# Altium footprint library AMMDK_Parts.PcbLib: 25 footprints (part 1 of 2)
Each footprint in its own frame and in the unit in brackets; x right, y up, seen from the top. Pads: shape width x height; smd on the part's side, far side on the other; paste and mask are expansions set on the pad; w line width, h text height; cw(c..) or ccw(c..) is an arc to the next point about the centre after c.
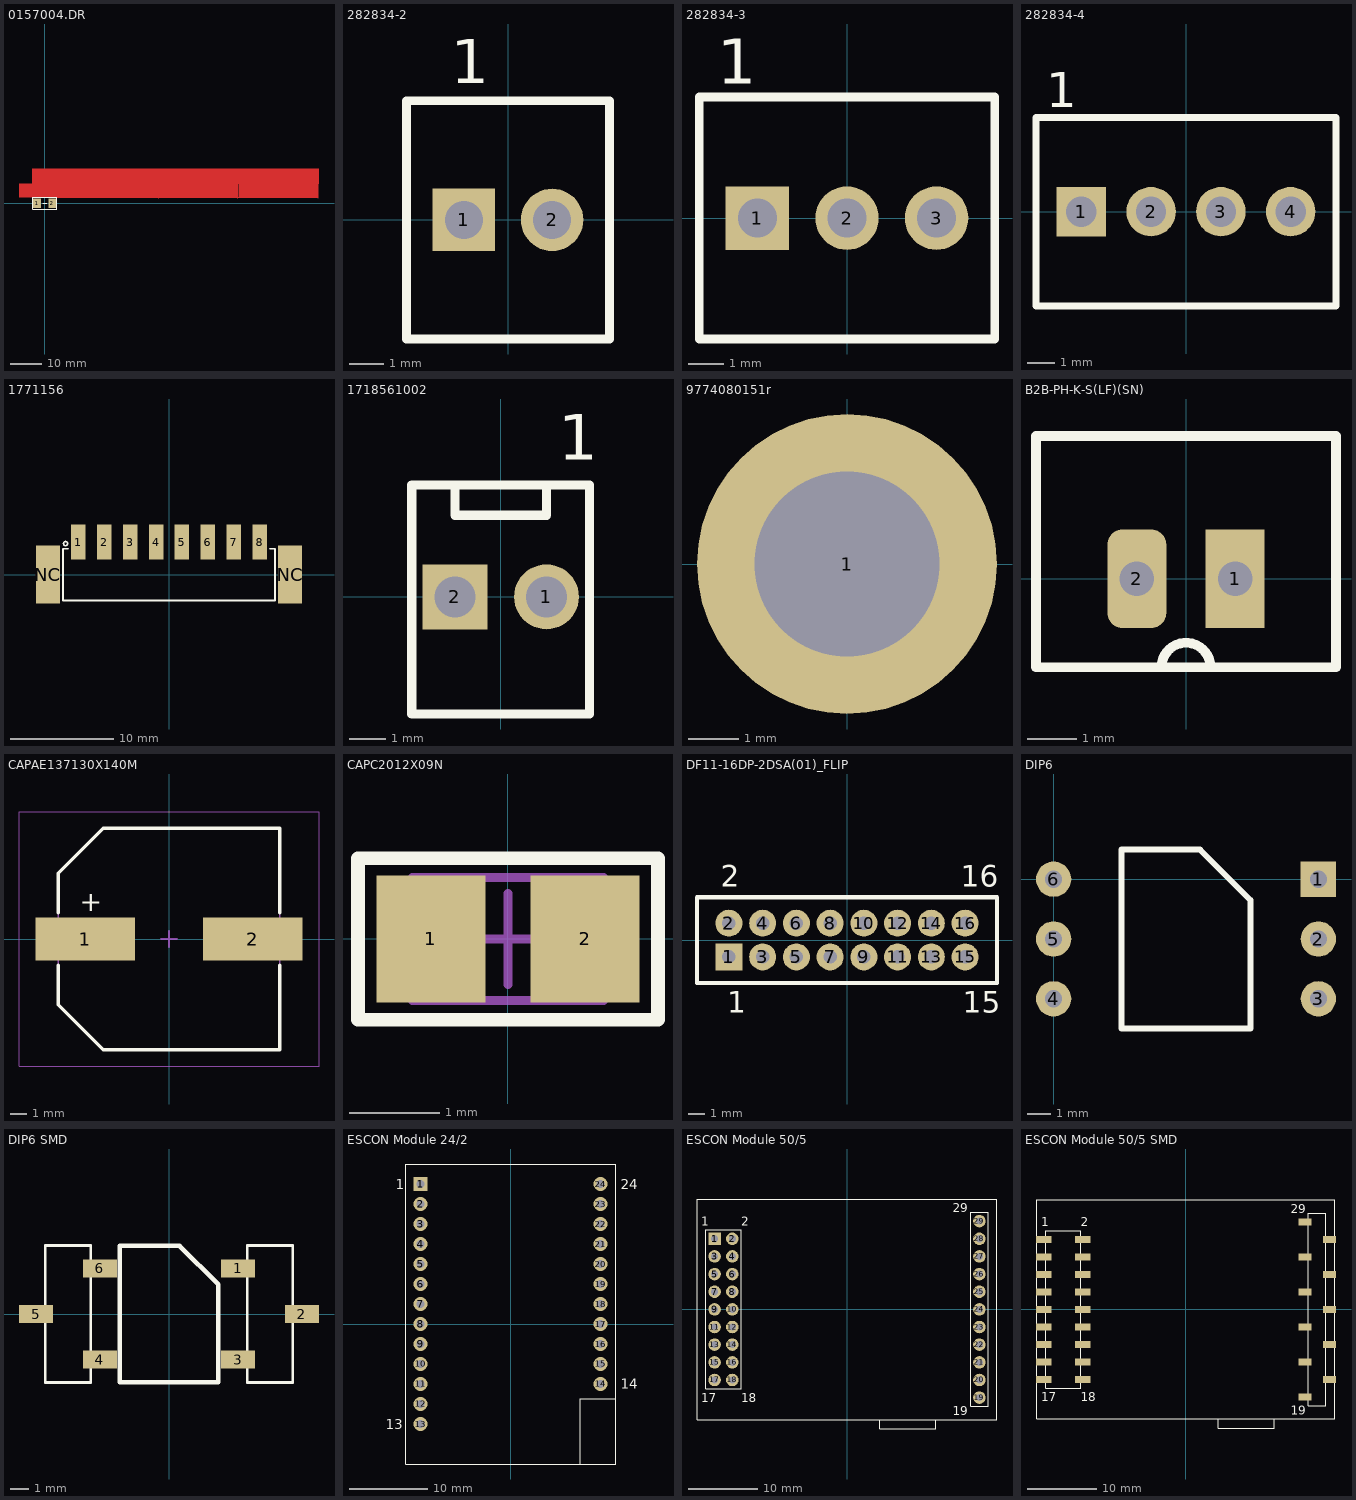
[diagram p0: the footprints below, top view; thin cyan lines are the x and y axes]

## 0157004.DR [mm]
pads (2):
  rect 2.4x3 smd: 1(-2.43,0) 2(2.43,0)
Top Layer:
  region: -3.9,10.843 36.313,10.843 36.313,6.086 -3.9,6.086
  region: -3.9,10.843 36.313,10.843 36.313,10.579 -3.9,10.579
  region: -3.9,6.351 36.313,6.351 36.313,6.086 -3.9,6.086
  region: 36.049,10.315 36.313,10.315 36.313,6.615 36.049,6.615
  region: 36.313,10.843 61.446,10.843 61.446,6.086 36.313,6.086
  region: 36.313,10.843 61.446,10.843 61.446,10.579 36.313,10.579
  region: 36.313,6.351 61.446,6.351 61.446,6.086 36.313,6.086
  region: 61.182,10.315 61.446,10.315 61.446,6.615 61.182,6.615
  region: 61.446,10.843 86.844,10.843 86.844,6.086 61.446,6.086
  region: 61.446,10.843 86.844,10.843 86.844,10.579 61.446,10.579
  region: 61.446,6.351 86.844,6.351 86.844,6.086 61.446,6.086
  region: 86.58,10.843 86.844,10.843 86.844,6.351 86.58,6.351
  region: -8.133,6.086 -4.165,6.086 -4.165,1.858 -8.133,1.858
  region: -3.9,6.086 0.333,6.086 0.333,1.858 -3.9,1.858
  region: 0.333,6.086 36.049,6.086 36.049,1.858 0.333,1.858
  region: 36.313,6.086 61.182,6.086 61.182,1.858 36.313,1.858
  region: 61.446,6.086 86.58,6.086 86.58,1.858 61.446,1.858
  lines w0.265: -3.9,1.858 86.58,1.858 86.58,6.086 86.58,1.594 ; 36.049,1.594 36.049,6.086 ; 61.182,1.594 61.182,6.086
  text "N" at -3.106,7.178 h3.33
  text "a" at -0.992,7.178 h3.33
  text "m" at 0.593,7.178 h3.33
  text "e" at 2.972,7.178 h3.33
  text "P" at 37.107,7.178 h3.33
  text "a" at 38.692,7.178 h3.33
  text "d" at 40.278,7.178 h3.33
  text "s" at 42.128,7.178 h3.33
  text "P" at 62.24,7.178 h3.33
  text "r" at 63.826,7.178 h3.33
  text "i" at 64.883,7.178 h3.33
  text "m" at 65.676,7.178 h3.33
  text "i" at 68.054,7.178 h3.33
  text "t" at 68.847,7.178 h3.33
  text "i" at 69.904,7.178 h3.33
  text "v" at 70.697,7.178 h3.33
  text "e" at 72.018,7.178 h3.33
  text "s" at 73.604,7.178 h3.33
  text "B" at 0.862,2.685 h3.33
  text "2" at 2.712,2.685 h3.33
  text "B" at 4.298,2.685 h3.33
  text "-" at 6.147,2.685 h3.33
  text "P" at 7.205,2.685 h3.33
  text "H" at 8.79,2.685 h3.33
  text "-" at 10.904,2.685 h3.33
  text "K" at 11.961,2.685 h3.33
  text "-" at 13.547,2.685 h3.33
  text "S" at 14.604,2.685 h3.33
  text "(" at 16.19,2.685 h3.33
  text "L" at 16.983,2.685 h3.33
  text "F" at 18.304,2.685 h3.33
  text ")" at 19.89,2.685 h3.33
  text "(" at 20.682,2.685 h3.33
  text "S" at 21.475,2.685 h3.33
  text "N" at 23.061,2.685 h3.33
  text ")" at 25.175,2.685 h3.33
  text "2" at 36.842,2.685 h3.33
  text "1" at 61.975,2.685 h3.33
  text "0" at 63.561,2.685 h3.33
Top Overlay:
  lines w0.254: -0.635,0 0.635,0 ; -3.81,-1.915 -3.81,1.915 3.81,1.915 3.81,-1.915 -3.81,-1.915
3D body: height 4.03, standoff 0, extent -3.81,-1.905 3.81,1.905

## 282834-2 [mm]
pads (2):
  rect 1.8x1.8 hole 1.1: 1(-1.27,0)
  round 1.8 hole 1.1: 2(1.27,0)
Top Overlay:
  lines w0.254: -2.921,-3.429 -2.921,3.429 2.921,3.429 2.921,-3.429 -2.921,-3.429
  text "1" at -1.651,3.937 h1.27
3D body "282834-2.sldprt": height 10, standoff -3.4, extent -2.77,-3.25 2.77,3.25

## 282834-3 [mm]
pads (3):
  rect 1.8x1.8 hole 1.1: 1(-2.54,0)
  round 1.8 hole 1.1: 2(0,0) 3(2.54,0)
Top Overlay:
  lines w0.254: -4.191,-3.429 4.191,-3.429 4.191,3.429 -4.191,3.429 -4.191,-3.429
  text "1" at -3.683,3.81 h1.27
3D body "c-282834-3-c-3d.stp": height 10, standoff -3.4, extent -4.04,-3.25 4.04,3.25

## 282834-4 [mm]
pads (4):
  rect 1.8x1.8 hole 1.1: 1(-3.81,0)
  round 1.8 hole 1.1: 2(-1.27,0) 3(1.27,0) 4(3.81,0)
Top Overlay:
  lines w0.254: -5.461,-3.429 -5.461,3.429 5.461,3.429 5.461,-3.429 -5.461,-3.429
  text "1" at -5.08,3.81 h1.27
3D body "282834-4.sldprt": height 10, standoff -3.4, extent -5.31,-3.25 5.31,3.25

## 1771156 [mm] "CONN TERM BLK 8POS 2.5MM SMD"
pads (10):
  rect 1.4x3.4 smd: 1(-8.75,3.15) 2(-6.25,3.15) 3(-3.75,3.15) 4(-1.25,3.15) 5(1.25,3.15) 6(3.75,3.15) 7(6.25,3.15) 8(8.75,3.15)
  rect 2.3x5.6 smd: NC(-11.7,0) NC(11.7,0)
Top Overlay:
  circle w0.152: c-10,3 r0.2
  lines w0.152: -9.75,2.5 -10.25,2.5 -10.25,-2.5 10.25,-2.5 10.25,2.5 9.75,2.5
3D body "1771156.stp": height 9, standoff 0, extent -12.55,-2.5 12.55,4.5

## 1718561002 [mm]
height 10.62
pads (2):
  round 1.8 hole 1.14: 1(1.27,0)
  rect 1.8x1.8 hole 1.14: 2(-1.27,0)
Top Overlay:
  lines w0.254: -1.27,3.1 -1.27,2.26 1.27,2.26 1.27,3.1 ; 2.465,-3.25 -2.465,-3.25 -2.465,3.1 2.465,3.1 2.465,-3.2
  text "1" at 1.6,3.8 h1.27
3D body "1718561002.sldprt": height 10.62, standoff -2.34, extent -2.464,-3.251 2.464,3.099

## 9774080151r [mm] "M2.5 Standoff"
height 8
pads (1):
  round 6 / inner round 0 / far side round 0 hole 3.7 unplated: 1(0,0)
3D body "9774080151r.sldprt": height 8, standoff -1.4, extent -2.55,-2.547 2.55,2.547

## B2B-PH-K-S(LF)(SN) [mm]
pads (2):
  rect 1.2x2 hole 0.7: 1(1,0)
  rrect50% 1.2x2 hole 0.7: 2(-1,0)
Top Overlay:
  lines w0.2: -0.5,-1.8 cw(c0,-1.8) 0.5,-1.8 ; -0.5,2.9 3.05,2.9 3.05,-1.8 -3.05,-1.8 -3.05,2.9 0.5,2.9
3D body: height 1.4, standoff -1.4, extent 0.016,0 0.016,0
3D body "B2B-PH-K-S.step": height 6, standoff -3.4, extent -2.95,-1.7 2.95,2.8

## CAPAE137130X140M [mm] "Aluminum Electrolytic Capacitor, Body 13.00x13.00x14.00mm, IPC Low Density"
height 14
pads (2):
  rect 5.95x2.55 smd: 1(-5,0) 2(5,0)
Top Overlay:
  lines w0.2: -6.6,-1.575 -6.6,-3.937 -3.938,-6.6 6.6,-6.6 6.6,-1.575 ; -6.6,1.575 -6.6,3.938 -3.938,6.6 6.6,6.6 6.6,1.575
  text "+" at -5.334,1.27 h2.03
Mechanical 13:
  lines w0.1: -6.6,-3.937 -3.938,-6.6 6.6,-6.6 6.6,6.6 -3.938,6.6 -6.6,3.938 -6.6,-3.937
Mechanical 15:
  lines w0.05: -8.95,-7.6 -8.95,7.6 8.95,7.6 8.95,-7.6 -8.95,-7.6
  lines w0.1: -0.5,0 0.5,0 ; 0,-0.5 0,0.5
3D body: height 4.67, standoff 0, extent -6.6,-6.6 6.6,6.6
3D body: height 14, standoff 0, extent -6.5,-6.5 6.5,6.5

## CAPC2012X09N [mm] "Chip Capacitor, 2-Leads, Body 2.00x1.25mm, IPC Medium Density"
height 0.95
pads (2):
  rect 1.2x1.4 smd: 1(-0.85,0) 2(0.85,0)
Top Overlay:
  lines w0.152: -1.651,-0.889 -1.651,0.889 1.651,0.889 1.651,-0.889 -1.651,-0.889
Mechanical 13:
  lines w0.1: -1.05,-0.675 -1.05,0.675 1.05,0.675 1.05,-0.675 -1.05,-0.675
Mechanical 15:
  lines w0.1: -0.5,0 0.5,0 ; 0,-0.5 0,0.5
3D body "CAPC2012X09N.step": height 0.95, standoff 0, extent -1.05,-0.675 1.05,0.675

## DF11-16DP-2DSA(01)_FLIP [mm]
height 6.6
pads (16):
  rect 1.6x1.6 hole 0.8: 1(-7,-1)
  round 1.6 hole 0.8: 2(-7,1) 3(-5,-1) 4(-5,1) 5(-3,-1) 6(-3,1) 7(-1,-1) 8(-1,1) 9(1,-1) 10(1,1) 11(3,-1) 12(3,1) 13(5,-1) 14(5,1) 15(7,-1) 16(7,1)
Top Overlay:
  lines w0.254: -8.89,-2.54 8.89,-2.54 8.89,2.54 -8.89,2.54 -8.89,-2.54
  text "1" at -7.112,-4.318 h1.27
  text "2" at -7.493,3.175 h1.27
  text "15" at 6.858,-4.318 h1.27
  text "16" at 6.731,3.175 h1.27
3D body "DF11-16DP-2DSA.sldprt": height 6.6, standoff -3, extent -9,-2.5 9,2.5

## DIP6 [mm]
pads (6):
  rect 1.5x1.5 hole 0.73: 1(11.25,0)
  round 1.5 hole 0.73: 2(11.25,-2.54) 3(11.25,-5.08) 4(0,-5.08) 5(0,-2.54) 6(0,0)
Top Overlay:
  lines w0.254: 6.223,1.27 2.885,1.27 2.885,-6.35 8.365,-6.35 8.365,-0.889 6.233,1.243
3D body "ABP Series DIP AN Wet Media.stp": height 14.41, standoff -3.84, extent -0.07,-6.54 11.43,1.46

## DIP6 SMD [mil]
pads (6):
  rect 75x40 smd: 1(151.46,100) 2(291.46,0) 3(151.46,-100) 4(-151.46,-100) 5(-291.46,0) 6(-151.46,100)
Top Overlay:
  lines w6: -271.46,-150 -271.46,150 -171.46,150 -171.46,-150 -271.46,-150 ; 171.46,-150 171.46,150 271.46,150 271.46,-150 171.46,-150
  lines w10: 23.54,150 -107.87,150 -107.87,-150 107.87,-150 107.87,65 23.94,148.94
3D body: height 177.17, standoff 0, extent 0,0 0,0
3D body "ABPDANT015PGAA5_SMD.sldprt": height 855.06, standoff 0, extent -311.45,-157.48 311.46,157.49

## ESCON Module 24/2 [mm]
pads (24):
  rect 1.8x1.8 hole 1.02: 1(-11.43,17.78)
  round 1.8 hole 1.02: 2(-11.43,15.24) 3(-11.43,12.7) 4(-11.43,10.16) 5(-11.43,7.62) 6(-11.43,5.08) 7(-11.43,2.54) 8(-11.43,0) 9(-11.43,-2.54) 10(-11.43,-5.08) 11(-11.43,-7.62) 12(-11.43,-10.16) 13(-11.43,-12.7) 14(11.43,-7.62) 15(11.43,-5.08) 16(11.43,-2.54) 17(11.43,0) 18(11.43,2.54) 19(11.43,5.08) 20(11.43,7.62) 21(11.43,10.16) 22(11.43,12.7) 23(11.43,15.24) 24(11.43,17.78)
Top Overlay:
  lines w0.152: 8.89,-17.78 8.89,-9.525 13.335,-9.525 ; -13.335,-17.78 -5.397,-17.78 5.397,-17.78 9.604,-17.78 10.398,-17.78 13.335,-17.78 13.335,20.32 -13.335,20.32 -13.335,-17.78
  text "24" at 13.97,17.145 h1.27
  text "14" at 13.97,-8.255 h1.27
  text "13" at -15.875,-13.335 h1.27
  text "1" at -14.605,17.145 h1.27
3D body "466023_escon_module_24-2.stp": height 12.61, standoff -0.39, extent -13.3,-17.617 13.37,19.27

## ESCON Module 50/5 [mm]
pads (29):
  rect 1.8x1.8 hole 1.02: 1(-19.05,10.16)
  round 1.8 hole 1.02: 2(-16.51,10.16) 3(-19.05,7.62) 4(-16.51,7.62) 5(-19.05,5.08) 6(-16.51,5.08) 7(-19.05,2.54) 8(-16.51,2.54) 9(-19.05,0) 10(-16.51,0) 11(-19.05,-2.54) 12(-16.51,-2.54) 13(-19.05,-5.08) 14(-16.51,-5.08) 15(-19.05,-7.62) 16(-16.51,-7.62) 17(-19.05,-10.16) 18(-16.51,-10.16) 19(19.05,-12.7) 20(19.05,-10.16) 21(19.05,-7.62) 22(19.05,-5.08) 23(19.05,-2.54) 24(19.05,0) 25(19.05,2.54) 26(19.05,5.08) 27(19.05,7.62) 28(19.05,10.16) 29(19.05,12.7)
Top Overlay:
  lines w0.152: 4.68,-15.875 4.68,-17.205 12.8,-17.205 12.8,-15.875 ; -21.59,-15.875 -21.59,15.875 21.59,15.875 21.59,-15.875 -21.59,-15.875 ; -20.32,-11.43 -15.24,-11.43 -15.24,11.43 -20.32,11.43 -20.32,-11.43 ; 17.78,-13.97 20.32,-13.97 20.32,13.97 17.78,13.97 17.78,-13.97
  text "1" at -20.955,12.065 h1.27
  text "18" at -15.24,-13.335 h1.27
  text "17" at -20.955,-13.335 h1.27
  text "2" at -15.24,12.065 h1.27
  text "19" at 15.24,-15.24 h1.27
  text "29" at 15.24,13.97 h1.27
3D body "escon_module_50-5.stp": height 7, standoff -6, extent -21.59,-17.202 21.59,15.875

## ESCON Module 50/5 SMD [mil]
pads (29):
  rect 87.5x40 smd: 1(-811.25,400) 2(-588.75,400) 3(-811.25,300) 4(-588.75,300) 5(-811.25,200) 6(-588.75,200) 7(-811.25,100) 8(-588.75,100) 9(-811.25,0) 10(-588.75,0) 11(-811.25,-100) 12(-588.75,-100) 13(-811.25,-200) 14(-588.75,-200) 15(-811.25,-300) 16(-588.75,-300) 17(-811.25,-400) 18(-588.75,-400)
  rect 75x40 smd: 19(680,-500) 20(820,-400) 21(680,-300) 22(820,-200) 23(680,-100) 24(820,0) 25(680,100) 26(820,200) 27(680,300) 28(820,400) 29(680,500)
Top Overlay:
  lines w6: 184.25,-625 184.25,-677.36 503.94,-677.36 503.94,-625 ; -850,-625 850,-625 850,625 -850,625 -850,-625 ; -800,-450 -800,450 -600,450 -600,-450 -800,-450 ; 700,-550 700,550 800,550 800,-550 700,-550
  text "29" at 600,550 h50
  text "19" at 600,-600 h50
  text "2" at -600,475 h50
  text "17" at -825,-525 h50
  text "18" at -600,-525 h50
  text "1" at -825,475 h50
3D body "escon_module_50-5_assembly.step": height 567.59, standoff -3, extent -850,-677.24 850,625